# Altium schematic symbol library SCHLIB.SchLib: 2608 symbols (part 18 of 20) (continued)
## R-350mR-2512 (continued)
RES 0.35 OHM 1% 1W 2512; Manufacturer Part Number: WSL2512R3500FEA; Manufacturer: Vishay Dale; Tolerance: 0.01; Temperature Coefficient: ±75ppm/°C; Object  Type: Part; Design Item ID: R-350mR-2512; Power: 1W; Composition: Metal Element; Features: Anti-Sulfur, Automotive AEC-Q200, Current Sense, Moisture Resistant, Pulse Withstanding; Operating Temperature: -65°C ~ 170°C; Height - Seated (Max): 0.89mm; Category: Resistor; Value: 350mR
footprint R2512
pins: 1, 2

## R-357K-0402
designator R?, comment Package: 0402  (hidden comment: 357K)
RES 357K OHM 1% 1/16W 0402; Manufacturer Part Number: RC0402FR-07357KL; Manufacturer: YAGEO; Tolerance: 0.01; Power: 0.063W; Temperature Coefficient: ±100ppm/°C; Object  Type: Part; Design Item ID: R-357K-0402; Value: 357K; Composition: Thick Film; Features: Moisture Resistant; Operating Temperature: -55°C ~ 155°C; Height - Seated (Max): 0.40mm; Category: Resistor
footprint R0402
pins: 1, 2

## R-357K-0603
designator R?, comment Package: 0603  (hidden comment: 357K)
RES SMD 357K OHM 1% 1/10W 0603; Manufacturer Part Number: CRCW0603357KFKEA; Manufacturer: Vishay Dale; Tolerance: 0.01; Power: 0.1W; Temperature Coefficient: ±100ppm/°C; Object  Type: Part; Design Item ID: R-357K-0603; Value: 357K; Composition: Thick Film; Features: Automotive AEC-Q200; Operating Temperature: -55°C ~ 155°C; Height - Seated (Max): 0.50mm; Category: Resistor
footprint R0603
pins: 1, 2

## R-357R-0402
designator R?, comment Package: 0402  (hidden comment: 357R)
RES 357 OHM 1% 1/16W 0402; Manufacturer Part Number: RC0402FR-07357RL; Manufacturer: YAGEO; Tolerance: 0.01; Power: 0.063W; Temperature Coefficient: ±100ppm/°C; Object  Type: Part; Design Item ID: R-357R-0402; Value: 357R; Composition: Thick Film; Features: Moisture Resistant; Operating Temperature: -55°C ~ 155°C; Height - Seated (Max): 0.40mm; Category: Resistor
footprint R0402
pins: 1, 2

## R-357R-0603
designator R?, comment Package: 0603  (hidden comment: 357R)
RES SMD 357 OHM 1% 1/10W 0603; Manufacturer Part Number: CRCW0603357RFKEA; Manufacturer: Vishay Dale; Tolerance: 0.01; Power: 0.1W; Temperature Coefficient: ±100ppm/°C; Object  Type: Part; Design Item ID: R-357R-0603; Value: 357R; Composition: Thick Film; Features: Automotive AEC-Q200; Operating Temperature: -55°C ~ 155°C; Height - Seated (Max): 0.50mm; Category: Resistor
footprint R0603
pins: 1, 2

## R-360K-0402
designator R?, comment Package: 0402  (hidden comment: 360K)
RES 360K OHM 1% 1/16W 0402; Manufacturer Part Number: RC0402FR-07360KL; Manufacturer: YAGEO; Tolerance: 0.01; Power: 0.063W; Temperature Coefficient: ±100ppm/°C; Object  Type: Part; Design Item ID: R-360K-0402; Value: 360K; Composition: Thick Film; Features: Moisture Resistant; Operating Temperature: -55°C ~ 155°C; Height - Seated (Max): 0.40mm; Category: Resistor
footprint R0402
pins: 1, 2

## R-360K-0603
designator R?, comment Package: 0603  (hidden comment: 360K)
RES SMD 360K OHM 1% 1/10W 0603; Manufacturer Part Number: CRCW0603360KFKEA; Manufacturer: Vishay Dale; Tolerance: 0.01; Power: 0.1W; Temperature Coefficient: ±100ppm/°C; Object  Type: Part; Design Item ID: R-360K-0603; Value: 360K; Composition: Thick Film; Features: Automotive AEC-Q200; Operating Temperature: -55°C ~ 155°C; Height - Seated (Max): 0.50mm; Category: Resistor
footprint R0603
pins: 1, 2

## R-360R-0402
designator R?, comment Package: 0402  (hidden comment: 360R)
RES 360 OHM 1% 1/16W 0402; Manufacturer Part Number: RC0402FR-07360RL; Manufacturer: YAGEO; Tolerance: 0.01; Power: 0.063W; Temperature Coefficient: ±100ppm/°C; Object  Type: Part; Design Item ID: R-360R-0402; Value: 360R; Composition: Thick Film; Features: Moisture Resistant; Operating Temperature: -55°C ~ 155°C; Height - Seated (Max): 0.40mm; Category: Resistor
footprint R0402
pins: 1, 2

## R-360R-0603
designator R?, comment Package: 0603  (hidden comment: 360R)
RES SMD 360 OHM 1% 1/10W 0603; Manufacturer Part Number: CRCW0603360RFKEA; Manufacturer: Vishay Dale; Tolerance: 0.01; Power: 0.1W; Temperature Coefficient: ±100ppm/°C; Object  Type: Part; Design Item ID: R-360R-0603; Value: 360R; Composition: Thick Film; Features: Automotive AEC-Q200; Operating Temperature: -55°C ~ 155°C; Height - Seated (Max): 0.50mm; Category: Resistor
footprint R0603
pins: 1, 2

## R-365K-0402
designator R?, comment Package: 0402  (hidden comment: 365K)
RES 365K OHM 1% 1/16W 0402; Manufacturer Part Number: RC0402FR-07365KL; Manufacturer: YAGEO; Tolerance: 0.01; Power: 0.063W; Temperature Coefficient: ±100ppm/°C; Object  Type: Part; Design Item ID: R-365K-0402; Value: 365K; Composition: Thick Film; Features: Moisture Resistant; Operating Temperature: -55°C ~ 155°C; Height - Seated (Max): 0.40mm; Category: Resistor
footprint R0402
pins: 1, 2

## R-365K-0603
designator R?, comment Package: 0603  (hidden comment: 365K)
RES SMD 365K OHM 1% 1/10W 0603; Manufacturer Part Number: CRCW0603365KFKEA; Manufacturer: Vishay Dale; Tolerance: 0.01; Power: 0.1W; Temperature Coefficient: ±100ppm/°C; Object  Type: Part; Design Item ID: R-365K-0603; Value: 365K; Composition: Thick Film; Features: Automotive AEC-Q200; Operating Temperature: -55°C ~ 155°C; Height - Seated (Max): 0.50mm; Category: Resistor
footprint R0603
pins: 1, 2

## R-365R-0402
designator R?, comment Package: 0402  (hidden comment: 365R)
RES 365 OHM 1% 1/16W 0402; Manufacturer Part Number: RC0402FR-07365RL; Manufacturer: YAGEO; Tolerance: 0.01; Power: 0.063W; Temperature Coefficient: ±100ppm/°C; Object  Type: Part; Design Item ID: R-365R-0402; Value: 365R; Composition: Thick Film; Features: Moisture Resistant; Operating Temperature: -55°C ~ 155°C; Height - Seated (Max): 0.40mm; Category: Resistor
footprint R0402
pins: 1, 2

## R-365R-0603
designator R?, comment Package: 0603  (hidden comment: 365R)
RES SMD 365 OHM 1% 1/10W 0603; Manufacturer Part Number: CRCW0603365RFKEA; Manufacturer: Vishay Dale; Tolerance: 0.01; Power: 0.1W; Temperature Coefficient: ±100ppm/°C; Object  Type: Part; Design Item ID: R-365R-0603; Value: 365R; Composition: Thick Film; Features: Automotive AEC-Q200; Operating Temperature: -55°C ~ 155°C; Height - Seated (Max): 0.50mm; Category: Resistor
footprint R0603
pins: 1, 2

## R-374K-0402
designator R?, comment Package: 0402  (hidden comment: 374K)
RES 374K OHM 1% 1/16W 0402; Manufacturer Part Number: RC0402FR-07374KL; Manufacturer: YAGEO; Tolerance: 0.01; Power: 0.063W; Temperature Coefficient: ±100ppm/°C; Object  Type: Part; Design Item ID: R-374K-0402; Value: 374K; Composition: Thick Film; Features: Moisture Resistant; Operating Temperature: -55°C ~ 155°C; Height - Seated (Max): 0.40mm; Category: Resistor
footprint R0402
pins: 1, 2

## R-374K-0603
designator R?, comment Package: 0603  (hidden comment: 374K)
RES SMD 374K OHM 1% 1/10W 0603; Manufacturer Part Number: CRCW0603374KFKEA; Manufacturer: Vishay Dale; Tolerance: 0.01; Power: 0.1W; Temperature Coefficient: ±100ppm/°C; Object  Type: Part; Design Item ID: R-374K-0603; Composition: Thick Film; Features: Automotive AEC-Q200; Operating Temperature: -55°C ~ 155°C; Height - Seated (Max): 0.50mm; Category: Resistor; Value: 374K
footprint R0603
pins: 1, 2

## R-374R-0402
designator R?, comment Package: 0402  (hidden comment: 374R)
RES 374 OHM 1% 1/16W 0402; Manufacturer Part Number: RC0402FR-07374RL; Manufacturer: YAGEO; Tolerance: 0.01; Power: 0.063W; Temperature Coefficient: ±100ppm/°C; Object  Type: Part; Design Item ID: R-374R-0402; Value: 374R; Composition: Thick Film; Features: Moisture Resistant; Operating Temperature: -55°C ~ 155°C; Height - Seated (Max): 0.40mm; Category: Resistor
footprint R0402
pins: 1, 2

## R-374R-0603
designator R?, comment Package: 0603  (hidden comment: 374R)
RES SMD 374 OHM 1% 1/10W 0603; Manufacturer Part Number: CRCW0603374RFKEA; Manufacturer: Vishay Dale; Tolerance: 0.01; Power: 0.1W; Temperature Coefficient: ±100ppm/°C; Object  Type: Part; Design Item ID: R-374R-0603; Value: 374R; Composition: Thick Film; Features: Automotive AEC-Q200; Operating Temperature: -55°C ~ 155°C; Height - Seated (Max): 0.50mm; Category: Resistor
footprint R0603
pins: 1, 2

## R-383K-0402
designator R?, comment Package: 0402  (hidden comment: 383K)
RES 383K OHM 1% 1/16W 0402; Manufacturer Part Number: RC0402FR-07383KL; Manufacturer: YAGEO; Tolerance: 0.01; Power: 0.063W; Temperature Coefficient: ±100ppm/°C; Object  Type: Part; Design Item ID: R-383K-0402; Value: 383K; Composition: Thick Film; Features: Moisture Resistant; Operating Temperature: -55°C ~ 155°C; Height - Seated (Max): 0.40mm; Category: Resistor
footprint R0402
pins: 1, 2

## R-383K-0603
designator R?, comment Package: 0603  (hidden comment: 383K)
RES SMD 383K OHM 1% 1/10W 0603; Manufacturer Part Number: CRCW0603383KFKEA; Manufacturer: Vishay Dale; Tolerance: 0.01; Power: 0.1W; Temperature Coefficient: ±100ppm/°C; Object  Type: Part; Design Item ID: R-383K-0603; Value: 383K; Composition: Thick Film; Features: Automotive AEC-Q200; Operating Temperature: -55°C ~ 155°C; Height - Seated (Max): 0.50mm; Category: Resistor
footprint R0603
pins: 1, 2

## R-383R-0402
designator R?, comment Package: 0402  (hidden comment: 383R)
RES 383 OHM 1% 1/16W 0402; Manufacturer Part Number: RC0402FR-07383RL; Manufacturer: YAGEO; Tolerance: 0.01; Power: 0.063W; Temperature Coefficient: ±100ppm/°C; Object  Type: Part; Design Item ID: R-383R-0402; Value: 383R; Composition: Thick Film; Features: Moisture Resistant; Operating Temperature: -55°C ~ 155°C; Height - Seated (Max): 0.40mm; Category: Resistor
footprint R0402
pins: 1, 2

## R-383R-0603
designator R?, comment Package: 0603  (hidden comment: 383R)
RES SMD 383 OHM 1% 1/10W 0603; Manufacturer Part Number: CRCW0603383RFKEA; Manufacturer: Vishay Dale; Tolerance: 0.01; Power: 0.1W; Temperature Coefficient: ±100ppm/°C; Object  Type: Part; Design Item ID: R-383R-0603; Value: 383R; Composition: Thick Film; Features: Automotive AEC-Q200; Operating Temperature: -55°C ~ 155°C; Height - Seated (Max): 0.50mm; Category: Resistor
footprint R0603
pins: 1, 2

## R-390K-0402
designator R?, comment Package: 0402  (hidden comment: 390K)
RES 390K OHM 1% 1/16W 0402; Manufacturer Part Number: RC0402FR-07390KL; Manufacturer: YAGEO; Tolerance: 0.01; Power: 0.063W; Temperature Coefficient: ±100ppm/°C; Object  Type: Part; Design Item ID: R-390K-0402; Value: 390K; Composition: Thick Film; Features: Moisture Resistant; Operating Temperature: -55°C ~ 155°C; Height - Seated (Max): 0.40mm; Category: Resistor
footprint R0402
pins: 1, 2

## R-390K-0603
designator R?, comment Package: 0603  (hidden comment: 390K)
RES SMD 390K OHM 1% 1/10W 0603; Manufacturer Part Number: CRCW0603390KFKEA; Manufacturer: Vishay Dale; Tolerance: 0.01; Power: 0.1W; Temperature Coefficient: ±100ppm/°C; Object  Type: Part; Design Item ID: R-390K-0603; Value: 390K; Composition: Thick Film; Features: Automotive AEC-Q200; Operating Temperature: -55°C ~ 155°C; Height - Seated (Max): 0.50mm; Category: Resistor
footprint R0603
pins: 1, 2

## R-390mR-2512
designator R?, comment Package: 2512  (hidden comment: 390mR)
RES 0.39 OHM 1% 1W 2512; Manufacturer Part Number: WSL2512R3900FEA; Manufacturer: Vishay Dale; Tolerance: 0.01; Temperature Coefficient: ±75ppm/°C; Object  Type: Part; Design Item ID: R-390mR-2512; Value: 390mR; Power: 1W; Composition: Metal Element; Features: Anti-Sulfur, Automotive AEC-Q200, Current Sense, Moisture Resistant, Pulse Withstanding; Operating Temperature: -65°C ~ 170°C; Height - Seated (Max): 0.89mm; Category: Resistor
footprint R2512
pins: 1, 2

## R-390R-0402
designator R?, comment Package: 0402  (hidden comment: 390R)
RES 390 OHM 1% 1/16W 0402; Manufacturer Part Number: RC0402FR-07390RL; Manufacturer: YAGEO; Tolerance: 0.01; Power: 0.063W; Temperature Coefficient: ±100ppm/°C; Object  Type: Part; Design Item ID: R-390R-0402; Value: 390R; Composition: Thick Film; Features: Moisture Resistant; Operating Temperature: -55°C ~ 155°C; Height - Seated (Max): 0.40mm; Category: Resistor
footprint R0402
pins: 1, 2

## R-390R-0603
designator R?, comment Package: 0603  (hidden comment: 390R)
RES SMD 390 OHM 1% 1/10W 0603; Manufacturer Part Number: CRCW0603390RFKEA; Manufacturer: Vishay Dale; Tolerance: 0.01; Power: 0.1W; Temperature Coefficient: ±100ppm/°C; Object  Type: Part; Design Item ID: R-390R-0603; Value: 390R; Composition: Thick Film; Features: Automotive AEC-Q200; Operating Temperature: -55°C ~ 155°C; Height - Seated (Max): 0.50mm; Category: Resistor
footprint R0603
pins: 1, 2

## R-392K-0402
designator R?, comment Package: 0402  (hidden comment: 392K)
RES 392K OHM 1% 1/16W 0402; Manufacturer Part Number: RC0402FR-07392KL; Manufacturer: YAGEO; Tolerance: 0.01; Power: 0.063W; Temperature Coefficient: ±100ppm/°C; Object  Type: Part; Design Item ID: R-392K-0402; Value: 392K; Composition: Thick Film; Features: Moisture Resistant; Operating Temperature: -55°C ~ 155°C; Height - Seated (Max): 0.40mm; Category: Resistor
footprint R0402
pins: 1, 2

## R-392K-0603
designator R?, comment Package: 0603  (hidden comment: 392K)
RES SMD 392K OHM 1% 1/10W 0603; Manufacturer Part Number: CRCW0603392KFKEA; Manufacturer: Vishay Dale; Tolerance: 0.01; Power: 0.1W; Temperature Coefficient: ±100ppm/°C; Object  Type: Part; Design Item ID: R-392K-0603; Value: 392K; Composition: Thick Film; Features: Automotive AEC-Q200; Operating Temperature: -55°C ~ 155°C; Height - Seated (Max): 0.50mm; Category: Resistor
footprint R0603
pins: 1, 2

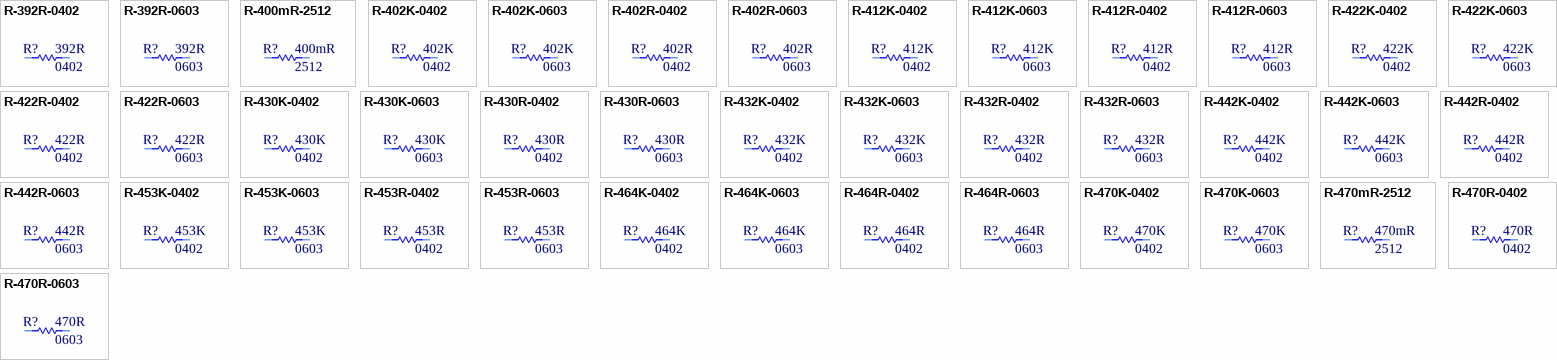
[diagram p77: symbols R-392R-0402 to R-470R-0603]

## R-392R-0402
designator R?, comment Package: 0402  (hidden comment: 392R)
RES 392 OHM 1% 1/16W 0402; Manufacturer Part Number: RC0402FR-07392RL; Manufacturer: YAGEO; Tolerance: 0.01; Power: 0.063W; Temperature Coefficient: ±100ppm/°C; Object  Type: Part; Design Item ID: R-392R-0402; Value: 392R; Composition: Thick Film; Features: Moisture Resistant; Operating Temperature: -55°C ~ 155°C; Height - Seated (Max): 0.40mm; Category: Resistor
footprint R0402
pins: 1, 2

## R-392R-0603
designator R?, comment Package: 0603  (hidden comment: 392R)
RES SMD 392 OHM 1% 1/10W 0603; Manufacturer Part Number: CRCW0603392RFKEA; Manufacturer: Vishay Dale; Tolerance: 0.01; Power: 0.1W; Temperature Coefficient: ±100ppm/°C; Object  Type: Part; Design Item ID: R-392R-0603; Value: 392R; Composition: Thick Film; Features: Automotive AEC-Q200; Operating Temperature: -55°C ~ 155°C; Height - Seated (Max): 0.50mm; Category: Resistor
footprint R0603
pins: 1, 2

## R-400mR-2512
designator R?, comment Package: 2512  (hidden comment: 400mR)
RES 0.4 OHM 1% 1W 2512; Manufacturer Part Number: WSL2512R4000FEA; Manufacturer: Vishay Dale; Tolerance: 0.01; Temperature Coefficient: ±75ppm/°C; Object  Type: Part; Design Item ID: R-400mR-2512; Value: 400mR; Power: 1W; Composition: Metal Element; Features: Anti-Sulfur, Automotive AEC-Q200, Current Sense, Moisture Resistant, Pulse Withstanding; Operating Temperature: -65°C ~ 170°C; Height - Seated (Max): 0.89mm; Category: Resistor
footprint R2512
pins: 1, 2

## R-402K-0402
designator R?, comment Package: 0402  (hidden comment: 402K)
RES 402K OHM 1% 1/16W 0402; Manufacturer Part Number: RC0402FR-07402KL; Manufacturer: YAGEO; Tolerance: 0.01; Power: 0.063W; Temperature Coefficient: ±100ppm/°C; Object  Type: Part; Design Item ID: R-402K-0402; Value: 402K; Composition: Thick Film; Features: Moisture Resistant; Operating Temperature: -55°C ~ 155°C; Height - Seated (Max): 0.40mm; Category: Resistor
footprint R0402
pins: 1, 2

## R-402K-0603
designator R?, comment Package: 0603  (hidden comment: 402K)
RES SMD 402K OHM 1% 1/10W 0603; Manufacturer Part Number: CRCW0603402KFKEA; Manufacturer: Vishay Dale; Tolerance: 0.01; Power: 0.1W; Temperature Coefficient: ±100ppm/°C; Object  Type: Part; Design Item ID: R-402K-0603; Composition: Thick Film; Features: Automotive AEC-Q200; Operating Temperature: -55°C ~ 155°C; Height - Seated (Max): 0.50mm; Category: Resistor; Value: 402K
footprint R0603
pins: 1, 2

## R-402R-0402
designator R?, comment Package: 0402  (hidden comment: 402R)
RES 402 OHM 1% 1/16W 0402; Manufacturer Part Number: RC0402FR-07402RL; Manufacturer: YAGEO; Tolerance: 0.01; Power: 0.063W; Temperature Coefficient: ±100ppm/°C; Object  Type: Part; Design Item ID: R-402R-0402; Value: 402R; Composition: Thick Film; Features: Moisture Resistant; Operating Temperature: -55°C ~ 155°C; Height - Seated (Max): 0.40mm; Category: Resistor
footprint R0402
pins: 1, 2

## R-402R-0603
designator R?, comment Package: 0603  (hidden comment: 402R)
RES SMD 402 OHM 1% 1/10W 0603; Manufacturer Part Number: CRCW0603402RFKEA; Manufacturer: Vishay Dale; Tolerance: 0.01; Power: 0.1W; Temperature Coefficient: ±100ppm/°C; Object  Type: Part; Design Item ID: R-402R-0603; Value: 402R; Composition: Thick Film; Features: Automotive AEC-Q200; Operating Temperature: -55°C ~ 155°C; Height - Seated (Max): 0.50mm; Category: Resistor
footprint R0603
pins: 1, 2

## R-412K-0402
designator R?, comment Package: 0402  (hidden comment: 412K)
RES 412K OHM 1% 1/16W 0402; Manufacturer Part Number: RC0402FR-07412KL; Manufacturer: YAGEO; Tolerance: 0.01; Power: 0.063W; Temperature Coefficient: ±100ppm/°C; Object  Type: Part; Design Item ID: R-412K-0402; Value: 412K; Composition: Thick Film; Features: Moisture Resistant; Operating Temperature: -55°C ~ 155°C; Height - Seated (Max): 0.40mm; Category: Resistor
footprint R0402
pins: 1, 2

## R-412K-0603
designator R?, comment Package: 0603  (hidden comment: 412K)
RES SMD 412K OHM 1% 1/10W 0603; Manufacturer Part Number: CRCW0603412KFKEA; Manufacturer: Vishay Dale; Tolerance: 0.01; Power: 0.1W; Temperature Coefficient: ±100ppm/°C; Object  Type: Part; Design Item ID: R-412K-0603; Value: 412K; Composition: Thick Film; Features: Automotive AEC-Q200; Operating Temperature: -55°C ~ 155°C; Height - Seated (Max): 0.50mm; Category: Resistor
footprint R0603
pins: 1, 2

## R-412R-0402
designator R?, comment Package: 0402  (hidden comment: 412R)
RES 412 OHM 1% 1/16W 0402; Manufacturer Part Number: RC0402FR-07412RL; Manufacturer: YAGEO; Tolerance: 0.01; Power: 0.063W; Temperature Coefficient: ±100ppm/°C; Object  Type: Part; Design Item ID: R-412R-0402; Value: 412R; Composition: Thick Film; Features: Moisture Resistant; Operating Temperature: -55°C ~ 155°C; Height - Seated (Max): 0.40mm; Category: Resistor
footprint R0402
pins: 1, 2

## R-412R-0603
designator R?, comment Package: 0603  (hidden comment: 412R)
RES SMD 412 OHM 1% 1/10W 0603; Manufacturer Part Number: CRCW0603412RFKEA; Manufacturer: Vishay Dale; Tolerance: 0.01; Power: 0.1W; Temperature Coefficient: ±100ppm/°C; Object  Type: Part; Design Item ID: R-412R-0603; Value: 412R; Composition: Thick Film; Features: Automotive AEC-Q200; Operating Temperature: -55°C ~ 155°C; Height - Seated (Max): 0.50mm; Category: Resistor
footprint R0603
pins: 1, 2

## R-422K-0402
designator R?, comment Package: 0402  (hidden comment: 422K)
RES 422K OHM 1% 1/16W 0402; Manufacturer Part Number: RC0402FR-07422KL; Manufacturer: YAGEO; Tolerance: 0.01; Power: 0.063W; Temperature Coefficient: ±100ppm/°C; Object  Type: Part; Design Item ID: R-422K-0402; Value: 422K; Composition: Thick Film; Features: Moisture Resistant; Operating Temperature: -55°C ~ 155°C; Height - Seated (Max): 0.40mm; Category: Resistor
footprint R0402
pins: 1, 2

## R-422K-0603
designator R?, comment Package: 0603  (hidden comment: 422K)
RES SMD 422K OHM 1% 1/10W 0603; Manufacturer Part Number: CRCW0603422KFKEA; Manufacturer: Vishay Dale; Tolerance: 0.01; Power: 0.1W; Temperature Coefficient: ±100ppm/°C; Object  Type: Part; Design Item ID: R-422K-0603; Value: 422K; Composition: Thick Film; Features: Automotive AEC-Q200; Operating Temperature: -55°C ~ 155°C; Height - Seated (Max): 0.50mm; Category: Resistor
footprint R0603
pins: 1, 2

## R-422R-0402
designator R?, comment Package: 0402  (hidden comment: 422R)
RES 422 OHM 1% 1/16W 0402; Manufacturer Part Number: RC0402FR-07422RL; Manufacturer: YAGEO; Tolerance: 0.01; Power: 0.063W; Temperature Coefficient: ±100ppm/°C; Object  Type: Part; Design Item ID: R-422R-0402; Value: 422R; Composition: Thick Film; Features: Moisture Resistant; Operating Temperature: -55°C ~ 155°C; Height - Seated (Max): 0.40mm; Category: Resistor
footprint R0402
pins: 1, 2

## R-422R-0603
designator R?, comment Package: 0603  (hidden comment: 422R)
RES SMD 422 OHM 1% 1/10W 0603; Manufacturer Part Number: CRCW0603422RFKEA; Manufacturer: Vishay Dale; Tolerance: 0.01; Power: 0.1W; Temperature Coefficient: ±100ppm/°C; Object  Type: Part; Design Item ID: R-422R-0603; Value: 422R; Composition: Thick Film; Features: Automotive AEC-Q200; Operating Temperature: -55°C ~ 155°C; Height - Seated (Max): 0.50mm; Category: Resistor
footprint R0603
pins: 1, 2

## R-430K-0402
designator R?, comment Package: 0402  (hidden comment: 430K)
RES 430K OHM 1% 1/16W 0402; Manufacturer Part Number: RC0402FR-07430KL; Manufacturer: YAGEO; Tolerance: 0.01; Power: 0.063W; Temperature Coefficient: ±100ppm/°C; Object  Type: Part; Design Item ID: R-430K-0402; Value: 430K; Composition: Thick Film; Features: Moisture Resistant; Operating Temperature: -55°C ~ 155°C; Height - Seated (Max): 0.40mm; Category: Resistor
footprint R0402
pins: 1, 2

## R-430K-0603
designator R?, comment Package: 0603  (hidden comment: 430K)
RES SMD 430K OHM 1% 1/10W 0603; Manufacturer Part Number: CRCW0603430KFKEA; Manufacturer: Vishay Dale; Tolerance: 0.01; Power: 0.1W; Temperature Coefficient: ±100ppm/°C; Object  Type: Part; Design Item ID: R-430K-0603; Value: 430K; Composition: Thick Film; Features: Automotive AEC-Q200; Operating Temperature: -55°C ~ 155°C; Height - Seated (Max): 0.50mm; Category: Resistor
footprint R0603
pins: 1, 2

## R-430R-0402
designator R?, comment Package: 0402  (hidden comment: 430R)
RES 430 OHM 1% 1/16W 0402; Manufacturer Part Number: RC0402FR-07430RL; Manufacturer: YAGEO; Tolerance: 0.01; Power: 0.063W; Temperature Coefficient: ±100ppm/°C; Object  Type: Part; Design Item ID: R-430R-0402; Value: 430R; Composition: Thick Film; Features: Moisture Resistant; Operating Temperature: -55°C ~ 155°C; Height - Seated (Max): 0.40mm; Category: Resistor
footprint R0402
pins: 1, 2

## R-430R-0603
designator R?, comment Package: 0603  (hidden comment: 430R)
RES SMD 430 OHM 1% 1/10W 0603; Manufacturer Part Number: CRCW0603430RFKEA; Manufacturer: Vishay Dale; Tolerance: 0.01; Power: 0.1W; Temperature Coefficient: ±100ppm/°C; Object  Type: Part; Design Item ID: R-430R-0603; Value: 430R; Composition: Thick Film; Features: Automotive AEC-Q200; Operating Temperature: -55°C ~ 155°C; Height - Seated (Max): 0.50mm; Category: Resistor
footprint R0603
pins: 1, 2

## R-432K-0402
designator R?, comment Package: 0402  (hidden comment: 432K)
RES 432K OHM 1% 1/16W 0402; Manufacturer Part Number: RC0402FR-07432KL; Manufacturer: YAGEO; Tolerance: 0.01; Power: 0.063W; Temperature Coefficient: ±100ppm/°C; Object  Type: Part; Design Item ID: R-432K-0402; Value: 432K; Composition: Thick Film; Features: Moisture Resistant; Operating Temperature: -55°C ~ 155°C; Height - Seated (Max): 0.40mm; Category: Resistor
footprint R0402
pins: 1, 2

## R-432K-0603
designator R?, comment Package: 0603  (hidden comment: 432K)
RES SMD 432K OHM 1% 1/10W 0603; Manufacturer Part Number: CRCW0603432KFKEA; Manufacturer: Vishay Dale; Tolerance: 0.01; Power: 0.1W; Temperature Coefficient: ±100ppm/°C; Object  Type: Part; Design Item ID: R-432K-0603; Value: 432K; Composition: Thick Film; Features: Automotive AEC-Q200; Operating Temperature: -55°C ~ 155°C; Height - Seated (Max): 0.50mm; Category: Resistor
footprint R0603
pins: 1, 2

## R-432R-0402
designator R?, comment Package: 0402  (hidden comment: 432R)
RES 432 OHM 1% 1/16W 0402; Manufacturer Part Number: RC0402FR-07432RL; Manufacturer: YAGEO; Tolerance: 0.01; Power: 0.063W; Temperature Coefficient: ±100ppm/°C; Object  Type: Part; Design Item ID: R-432R-0402; Value: 432R; Composition: Thick Film; Features: Moisture Resistant; Operating Temperature: -55°C ~ 155°C; Height - Seated (Max): 0.40mm; Category: Resistor
footprint R0402
pins: 1, 2

## R-432R-0603
designator R?, comment Package: 0603  (hidden comment: 432R)
RES SMD 432 OHM 1% 1/10W 0603; Manufacturer Part Number: CRCW0603432RFKEA; Manufacturer: Vishay Dale; Tolerance: 0.01; Power: 0.1W; Temperature Coefficient: ±100ppm/°C; Object  Type: Part; Design Item ID: R-432R-0603; Value: 432R; Composition: Thick Film; Features: Automotive AEC-Q200; Operating Temperature: -55°C ~ 155°C; Height - Seated (Max): 0.50mm; Category: Resistor
footprint R0603
pins: 1, 2

## R-442K-0402
designator R?, comment Package: 0402  (hidden comment: 442K)
RES 442K OHM 1% 1/16W 0402; Manufacturer Part Number: RC0402FR-07442KL; Manufacturer: YAGEO; Tolerance: 0.01; Power: 0.063W; Temperature Coefficient: ±100ppm/°C; Object  Type: Part; Design Item ID: R-442K-0402; Value: 442K; Composition: Thick Film; Features: Moisture Resistant; Operating Temperature: -55°C ~ 155°C; Height - Seated (Max): 0.40mm; Category: Resistor
footprint R0402
pins: 1, 2

## R-442K-0603
designator R?, comment Package: 0603  (hidden comment: 442K)
RES SMD 442K OHM 1% 1/10W 0603; Manufacturer Part Number: CRCW0603442KFKEA; Manufacturer: Vishay Dale; Tolerance: 0.01; Power: 0.1W; Temperature Coefficient: ±100ppm/°C; Object  Type: Part; Design Item ID: R-442K-0603; Value: 442K; Composition: Thick Film; Features: Automotive AEC-Q200; Operating Temperature: -55°C ~ 155°C; Height - Seated (Max): 0.50mm; Category: Resistor
footprint R0603
pins: 1, 2

## R-442R-0402
designator R?, comment Package: 0402  (hidden comment: 442R)
RES 442 OHM 1% 1/16W 0402; Manufacturer Part Number: RC0402FR-07442RL; Manufacturer: YAGEO; Tolerance: 0.01; Power: 0.063W; Temperature Coefficient: ±100ppm/°C; Object  Type: Part; Design Item ID: R-442R-0402; Value: 442R; Composition: Thick Film; Features: Moisture Resistant; Operating Temperature: -55°C ~ 155°C; Height - Seated (Max): 0.40mm; Category: Resistor
footprint R0402
pins: 1, 2

## R-442R-0603
designator R?, comment Package: 0603  (hidden comment: 442R)
RES SMD 442 OHM 1% 1/10W 0603; Manufacturer Part Number: CRCW0603442RFKEA; Manufacturer: Vishay Dale; Tolerance: 0.01; Power: 0.1W; Temperature Coefficient: ±100ppm/°C; Object  Type: Part; Design Item ID: R-442R-0603; Value: 442R; Composition: Thick Film; Features: Automotive AEC-Q200; Operating Temperature: -55°C ~ 155°C; Height - Seated (Max): 0.50mm; Category: Resistor
footprint R0603
pins: 1, 2

## R-453K-0402
designator R?, comment Package: 0402  (hidden comment: 453K)
RES 453K OHM 1% 1/16W 0402; Manufacturer Part Number: RC0402FR-07453KL; Manufacturer: YAGEO; Tolerance: 0.01; Power: 0.063W; Temperature Coefficient: ±100ppm/°C; Object  Type: Part; Design Item ID: R-453K-0402; Value: 453K; Composition: Thick Film; Features: Moisture Resistant; Operating Temperature: -55°C ~ 155°C; Height - Seated (Max): 0.40mm; Category: Resistor
footprint R0402
pins: 1, 2

## R-453K-0603
designator R?, comment Package: 0603  (hidden comment: 453K)
RES SMD 453K OHM 1% 1/10W 0603; Manufacturer Part Number: CRCW0603453KFKEA; Manufacturer: Vishay Dale; Tolerance: 0.01; Power: 0.1W; Temperature Coefficient: ±100ppm/°C; Object  Type: Part; Design Item ID: R-453K-0603; Value: 453K; Composition: Thick Film; Features: Automotive AEC-Q200; Operating Temperature: -55°C ~ 155°C; Height - Seated (Max): 0.50mm; Category: Resistor
footprint R0603
pins: 1, 2

## R-453R-0402
designator R?, comment Package: 0402  (hidden comment: 453R)
RES 453 OHM 1% 1/16W 0402; Manufacturer Part Number: RC0402FR-07453RL; Manufacturer: YAGEO; Tolerance: 0.01; Power: 0.063W; Temperature Coefficient: ±100ppm/°C; Object  Type: Part; Design Item ID: R-453R-0402; Value: 453R; Composition: Thick Film; Features: Moisture Resistant; Operating Temperature: -55°C ~ 155°C; Height - Seated (Max): 0.40mm; Category: Resistor
footprint R0402
pins: 1, 2

## R-453R-0603
designator R?, comment Package: 0603  (hidden comment: 453R)
RES SMD 453 OHM 1% 1/10W 0603; Manufacturer Part Number: CRCW0603453RFKEA; Manufacturer: Vishay Dale; Tolerance: 0.01; Power: 0.1W; Temperature Coefficient: ±100ppm/°C; Object  Type: Part; Design Item ID: R-453R-0603; Value: 453R; Composition: Thick Film; Features: Automotive AEC-Q200; Operating Temperature: -55°C ~ 155°C; Height - Seated (Max): 0.50mm; Category: Resistor
footprint R0603
pins: 1, 2

## R-464K-0402
designator R?, comment Package: 0402  (hidden comment: 464K)
RES 464K OHM 1% 1/16W 0402; Manufacturer Part Number: RC0402FR-07464KL; Manufacturer: YAGEO; Tolerance: 0.01; Power: 0.063W; Temperature Coefficient: ±100ppm/°C; Object  Type: Part; Design Item ID: R-464K-0402; Value: 464K; Composition: Thick Film; Features: Moisture Resistant; Operating Temperature: -55°C ~ 155°C; Height - Seated (Max): 0.40mm; Category: Resistor
footprint R0402
pins: 1, 2

## R-464K-0603
designator R?, comment Package: 0603  (hidden comment: 464K)
RES SMD 464K OHM 1% 1/10W 0603; Manufacturer Part Number: CRCW0603464KFKEA; Manufacturer: Vishay Dale; Tolerance: 0.01; Power: 0.1W; Temperature Coefficient: ±100ppm/°C; Object  Type: Part; Design Item ID: R-464K-0603; Value: 464K; Composition: Thick Film; Features: Automotive AEC-Q200; Operating Temperature: -55°C ~ 155°C; Height - Seated (Max): 0.50mm; Category: Resistor
footprint R0603
pins: 1, 2

## R-464R-0402
designator R?, comment Package: 0402  (hidden comment: 464R)
RES 464 OHM 1% 1/16W 0402; Manufacturer Part Number: RC0402FR-07464RL; Manufacturer: YAGEO; Tolerance: 0.01; Power: 0.063W; Temperature Coefficient: ±100ppm/°C; Object  Type: Part; Design Item ID: R-464R-0402; Value: 464R; Composition: Thick Film; Features: Moisture Resistant; Operating Temperature: -55°C ~ 155°C; Height - Seated (Max): 0.40mm; Category: Resistor
footprint R0402
pins: 1, 2

## R-464R-0603
designator R?, comment Package: 0603  (hidden comment: 464R)
RES SMD 464 OHM 1% 1/10W 0603; Manufacturer Part Number: CRCW0603464RFKEA; Manufacturer: Vishay Dale; Tolerance: 0.01; Power: 0.1W; Temperature Coefficient: ±100ppm/°C; Object  Type: Part; Design Item ID: R-464R-0603; Value: 464R; Composition: Thick Film; Features: Automotive AEC-Q200; Operating Temperature: -55°C ~ 155°C; Height - Seated (Max): 0.50mm; Category: Resistor
footprint R0603
pins: 1, 2

## R-470K-0402
designator R?, comment Package: 0402  (hidden comment: 470K)
RES 470K OHM 1% 1/16W 0402; Manufacturer Part Number: RC0402FR-07470KL; Manufacturer: YAGEO; Tolerance: 0.01; Power: 0.063W; Temperature Coefficient: ±100ppm/°C; Object  Type: Part; Design Item ID: R-470K-0402; Value: 470K; Composition: Thick Film; Features: Moisture Resistant; Operating Temperature: -55°C ~ 155°C; Height - Seated (Max): 0.40mm; Category: Resistor
footprint R0402
pins: 1, 2

## R-470K-0603
designator R?, comment Package: 0603  (hidden comment: 470K)
RES SMD 470K OHM 1% 1/10W 0603; Manufacturer Part Number: CRCW0603470KFKEA; Manufacturer: Vishay Dale; Tolerance: 0.01; Power: 0.1W; Temperature Coefficient: ±100ppm/°C; Object  Type: Part; Design Item ID: R-470K-0603; Value: 470K; Composition: Thick Film; Features: Automotive AEC-Q200; Operating Temperature: -55°C ~ 155°C; Height - Seated (Max): 0.50mm; Category: Resistor
footprint R0603
pins: 1, 2

## R-470mR-2512
designator R?, comment Package: 2512  (hidden comment: 470mR)
RES 0.47 OHM 1% 1W 2512; Manufacturer Part Number: WSL2512R4700FEA; Manufacturer: Vishay Dale; Tolerance: 0.01; Temperature Coefficient: ±75ppm/°C; Object  Type: Part; Design Item ID: R-470mR-2512; Value: 470mR; Power: 1W; Composition: Metal Element; Features: Anti-Sulfur, Automotive AEC-Q200, Current Sense, Moisture Resistant, Pulse Withstanding; Operating Temperature: -65°C ~ 170°C; Height - Seated (Max): 0.89mm; Category: Resistor
footprint R2512
pins: 1, 2

## R-470R-0402
designator R?, comment Package: 0402  (hidden comment: 470R)
RES 470 OHM 1% 1/16W 0402; Manufacturer Part Number: RC0402FR-07470RL; Manufacturer: YAGEO; Tolerance: 0.01; Power: 0.063W; Temperature Coefficient: ±100ppm/°C; Object  Type: Part; Design Item ID: R-470R-0402; Composition: Thick Film; Features: Moisture Resistant; Operating Temperature: -55°C ~ 155°C; Height - Seated (Max): 0.40mm; Category: Resistor; Value: 470R
footprint R0402
pins: 1, 2

## R-470R-0603
designator R?, comment Package: 0603  (hidden comment: 470R)
RES SMD 470 OHM 1% 1/10W 0603; Manufacturer Part Number: CRCW0603470RFKEA; Manufacturer: Vishay Dale; Tolerance: 0.01; Power: 0.1W; Temperature Coefficient: ±100ppm/°C; Object  Type: Part; Design Item ID: R-470R-0603; Value: 470R; Composition: Thick Film; Features: Automotive AEC-Q200; Operating Temperature: -55°C ~ 155°C; Height - Seated (Max): 0.50mm; Category: Resistor
footprint R0603
pins: 1, 2

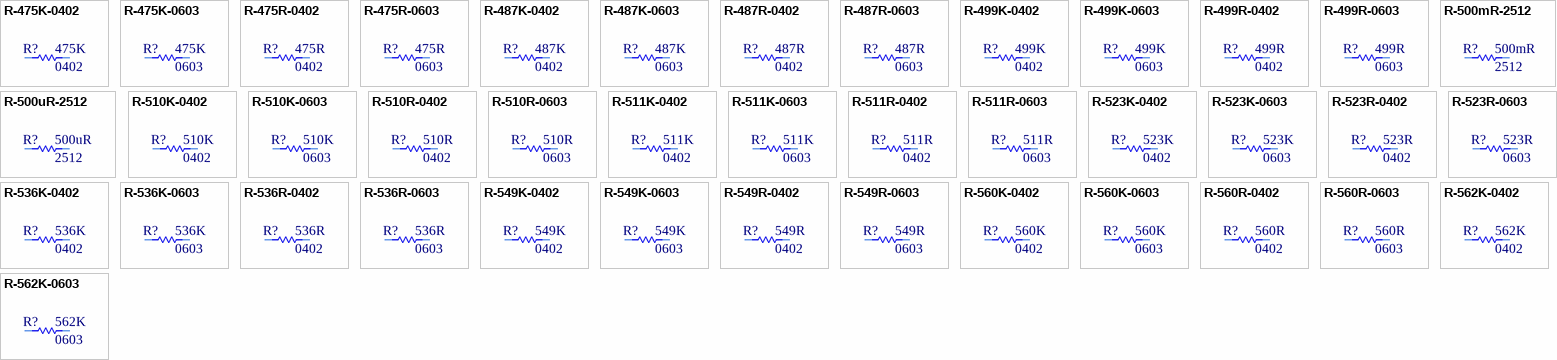
[diagram p78: symbols R-475K-0402 to R-562K-0603]

## R-475K-0402
designator R?, comment Package: 0402  (hidden comment: 475K)
RES 475K OHM 1% 1/16W 0402; Manufacturer Part Number: RC0402FR-07475KL; Manufacturer: YAGEO; Tolerance: 0.01; Power: 0.063W; Temperature Coefficient: ±100ppm/°C; Object  Type: Part; Design Item ID: R-475K-0402; Value: 475K; Composition: Thick Film; Features: Moisture Resistant; Operating Temperature: -55°C ~ 155°C; Height - Seated (Max): 0.40mm; Category: Resistor
footprint R0402
pins: 1, 2

## R-475K-0603
designator R?, comment Package: 0603  (hidden comment: 475K)
RES SMD 475K OHM 1% 1/10W 0603; Manufacturer Part Number: CRCW0603475KFKEA; Manufacturer: Vishay Dale; Tolerance: 0.01; Power: 0.1W; Temperature Coefficient: ±100ppm/°C; Object  Type: Part; Design Item ID: R-475K-0603; Composition: Thick Film; Features: Automotive AEC-Q200; Operating Temperature: -55°C ~ 155°C; Height - Seated (Max): 0.50mm; Category: Resistor; Value: 475K
footprint R0603
pins: 1, 2

## R-475R-0402
designator R?, comment Package: 0402  (hidden comment: 475R)
RES 475 OHM 1% 1/16W 0402; Manufacturer Part Number: RC0402FR-07475RL; Manufacturer: YAGEO; Tolerance: 0.01; Power: 0.063W; Temperature Coefficient: ±100ppm/°C; Object  Type: Part; Design Item ID: R-475R-0402; Value: 475R; Composition: Thick Film; Features: Moisture Resistant; Operating Temperature: -55°C ~ 155°C; Height - Seated (Max): 0.40mm; Category: Resistor
footprint R0402
pins: 1, 2

## R-475R-0603
designator R?, comment Package: 0603  (hidden comment: 475R)
RES SMD 475 OHM 1% 1/10W 0603; Manufacturer Part Number: CRCW0603475RFKEA; Manufacturer: Vishay Dale; Tolerance: 0.01; Power: 0.1W; Temperature Coefficient: ±100ppm/°C; Object  Type: Part; Design Item ID: R-475R-0603; Value: 475R; Composition: Thick Film; Features: Automotive AEC-Q200; Operating Temperature: -55°C ~ 155°C; Height - Seated (Max): 0.50mm; Category: Resistor
footprint R0603
pins: 1, 2

## R-487K-0402
designator R?, comment Package: 0402  (hidden comment: 487K)
RES 487K OHM 1% 1/16W 0402; Manufacturer Part Number: RC0402FR-07487KL; Manufacturer: YAGEO; Tolerance: 0.01; Power: 0.063W; Temperature Coefficient: ±100ppm/°C; Object  Type: Part; Design Item ID: R-487K-0402; Value: 487K; Composition: Thick Film; Features: Moisture Resistant; Operating Temperature: -55°C ~ 155°C; Height - Seated (Max): 0.40mm; Category: Resistor
footprint R0402
pins: 1, 2

## R-487K-0603
designator R?, comment Package: 0603  (hidden comment: 487K)
RES SMD 487K OHM 1% 1/10W 0603; Manufacturer Part Number: CRCW0603487KFKEA; Manufacturer: Vishay Dale; Tolerance: 0.01; Power: 0.1W; Temperature Coefficient: ±100ppm/°C; Object  Type: Part; Design Item ID: R-487K-0603; Value: 487K; Composition: Thick Film; Features: Automotive AEC-Q200; Operating Temperature: -55°C ~ 155°C; Height - Seated (Max): 0.50mm; Category: Resistor
footprint R0603
pins: 1, 2

## R-487R-0402
designator R?, comment Package: 0402  (hidden comment: 487R)
RES 487 OHM 1% 1/16W 0402; Manufacturer Part Number: RC0402FR-07487RL; Manufacturer: YAGEO; Tolerance: 0.01; Power: 0.063W; Temperature Coefficient: ±100ppm/°C; Object  Type: Part; Design Item ID: R-487R-0402; Value: 487R; Composition: Thick Film; Features: Moisture Resistant; Operating Temperature: -55°C ~ 155°C; Height - Seated (Max): 0.40mm; Category: Resistor
footprint R0402
pins: 1, 2

## R-487R-0603
designator R?, comment Package: 0603  (hidden comment: 487R)
RES SMD 487 OHM 1% 1/10W 0603; Manufacturer Part Number: CRCW0603487RFKEA; Manufacturer: Vishay Dale; Tolerance: 0.01; Power: 0.1W; Temperature Coefficient: ±100ppm/°C; Object  Type: Part; Design Item ID: R-487R-0603; Value: 487R; Composition: Thick Film; Features: Automotive AEC-Q200; Operating Temperature: -55°C ~ 155°C; Height - Seated (Max): 0.50mm; Category: Resistor
footprint R0603
pins: 1, 2

## R-499K-0402
designator R?, comment Package: 0402  (hidden comment: 499K)
RES 499K OHM 1% 1/16W 0402; Manufacturer Part Number: RC0402FR-07499KL; Manufacturer: YAGEO; Tolerance: 0.01; Power: 0.063W; Temperature Coefficient: ±100ppm/°C; Object  Type: Part; Design Item ID: R-499K-0402; Value: 499K; Composition: Thick Film; Features: Moisture Resistant; Operating Temperature: -55°C ~ 155°C; Height - Seated (Max): 0.40mm; Category: Resistor
footprint R0402
pins: 1, 2

## R-499K-0603
designator R?, comment Package: 0603  (hidden comment: 499K)
RES SMD 499K OHM 1% 1/10W 0603; Manufacturer Part Number: CRCW0603499KFKEA; Manufacturer: Vishay Dale; Tolerance: 0.01; Power: 0.1W; Temperature Coefficient: ±100ppm/°C; Object  Type: Part; Design Item ID: R-499K-0603; Value: 499K; Composition: Thick Film; Features: Automotive AEC-Q200; Operating Temperature: -55°C ~ 155°C; Height - Seated (Max): 0.50mm; Category: Resistor
footprint R0603
pins: 1, 2

## R-499R-0402
designator R?, comment Package: 0402  (hidden comment: 499R)
RES 499 OHM 1% 1/16W 0402; Manufacturer Part Number: RC0402FR-07499RL; Manufacturer: YAGEO; Tolerance: 0.01; Power: 0.063W; Temperature Coefficient: ±100ppm/°C; Object  Type: Part; Design Item ID: R-499R-0402; Value: 499R; Composition: Thick Film; Features: Moisture Resistant; Operating Temperature: -55°C ~ 155°C; Height - Seated (Max): 0.40mm; Category: Resistor
footprint R0402
pins: 1, 2

## R-499R-0603
designator R?, comment Package: 0603  (hidden comment: 499R)
RES SMD 499 OHM 1% 1/10W 0603; Manufacturer Part Number: CRCW0603499RFKEA; Manufacturer: Vishay Dale; Tolerance: 0.01; Power: 0.1W; Temperature Coefficient: ±100ppm/°C; Object  Type: Part; Design Item ID: R-499R-0603; Value: 499R; Composition: Thick Film; Features: Automotive AEC-Q200; Operating Temperature: -55°C ~ 155°C; Height - Seated (Max): 0.50mm; Category: Resistor
footprint R0603
pins: 1, 2

## R-500mR-2512
designator R?, comment Package: 2512  (hidden comment: 500mR)
RES 0.5 OHM 1% 1W 2512; Manufacturer Part Number: WSL2512R5000FEA; Manufacturer: Vishay Dale; Tolerance: 0.01; Temperature Coefficient: ±75ppm/°C; Object  Type: Part; Design Item ID: R-500mR-2512; Value: 500mR; Power: 1W; Composition: Metal Element; Features: Anti-Sulfur, Automotive AEC-Q200, Current Sense, Moisture Resistant, Pulse Withstanding; Operating Temperature: -65°C ~ 170°C; Height - Seated (Max): 0.89mm; Category: Resistor
footprint R2512
pins: 1, 2

## R-500uR-2512
designator R?, comment Package: 2512  (hidden comment: 500uR)
RES 500 UOHM 1% 1W 2512; Manufacturer Part Number: WSL2512L5000FEA; Manufacturer: Vishay Dale; Tolerance: 0.01; Temperature Coefficient: ±400ppm/°C; Object  Type: Part; Design Item ID: R-500uR-2512; Value: 500uR; Power: 1W; Composition: Metal Element; Features: Automotive AEC-Q200, Current Sense, Moisture Resistant, Pulse Withstanding; Operating Temperature: -65°C ~ 170°C; Height - Seated (Max): 0.89mm; Category: Resistor
footprint R2512
pins: 1, 2

## R-510K-0402
designator R?, comment Package: 0402  (hidden comment: 510K)
RES 510K OHM 1% 1/16W 0402; Manufacturer Part Number: RC0402FR-07510KL; Manufacturer: YAGEO; Tolerance: 0.01; Power: 0.063W; Temperature Coefficient: ±100ppm/°C; Object  Type: Part; Design Item ID: R-510K-0402; Composition: Thick Film; Features: Moisture Resistant; Operating Temperature: -55°C ~ 155°C; Height - Seated (Max): 0.40mm; Category: Resistor; Value: 510K
footprint R0402
pins: 1, 2

## R-510K-0603
designator R?, comment Package: 0603  (hidden comment: 510K)
RES SMD 510K OHM 1% 1/10W 0603; Manufacturer Part Number: CRCW0603510KFKEA; Manufacturer: Vishay Dale; Tolerance: 0.01; Power: 0.1W; Temperature Coefficient: ±100ppm/°C; Object  Type: Part; Design Item ID: R-510K-0603; Value: 510K; Composition: Thick Film; Features: Automotive AEC-Q200; Operating Temperature: -55°C ~ 155°C; Height - Seated (Max): 0.50mm; Category: Resistor
footprint R0603
pins: 1, 2

## R-510R-0402
designator R?, comment Package: 0402  (hidden comment: 510R)
RES 510 OHM 1% 1/16W 0402; Manufacturer Part Number: RC0402FR-07510RL; Manufacturer: YAGEO; Tolerance: 0.01; Power: 0.063W; Temperature Coefficient: ±100ppm/°C; Object  Type: Part; Design Item ID: R-510R-0402; Value: 510R; Composition: Thick Film; Features: Moisture Resistant; Operating Temperature: -55°C ~ 155°C; Height - Seated (Max): 0.40mm; Category: Resistor
footprint R0402
pins: 1, 2

## R-510R-0603
designator R?, comment Package: 0603  (hidden comment: 510R)
RES SMD 510 OHM 1% 1/10W 0603; Manufacturer Part Number: CRCW0603510RFKEA; Manufacturer: Vishay Dale; Tolerance: 0.01; Power: 0.1W; Temperature Coefficient: ±100ppm/°C; Object  Type: Part; Design Item ID: R-510R-0603; Value: 510R; Composition: Thick Film; Features: Automotive AEC-Q200; Operating Temperature: -55°C ~ 155°C; Height - Seated (Max): 0.50mm; Category: Resistor
footprint R0603
pins: 1, 2

## R-511K-0402
designator R?, comment Package: 0402  (hidden comment: 511K)
RES 511K OHM 1% 1/16W 0402; Manufacturer Part Number: RC0402FR-07511KL; Manufacturer: YAGEO; Tolerance: 0.01; Power: 0.063W; Temperature Coefficient: ±100ppm/°C; Object  Type: Part; Design Item ID: R-511K-0402; Value: 511K; Composition: Thick Film; Features: Moisture Resistant; Operating Temperature: -55°C ~ 155°C; Height - Seated (Max): 0.40mm; Category: Resistor
footprint R0402
pins: 1, 2

## R-511K-0603
designator R?, comment Package: 0603  (hidden comment: 511K)
RES SMD 511K OHM 1% 1/10W 0603; Manufacturer Part Number: CRCW0603511KFKEA; Manufacturer: Vishay Dale; Tolerance: 0.01; Power: 0.1W; Temperature Coefficient: ±100ppm/°C; Object  Type: Part; Design Item ID: R-511K-0603; Value: 511K; Composition: Thick Film; Features: Automotive AEC-Q200; Operating Temperature: -55°C ~ 155°C; Height - Seated (Max): 0.50mm; Category: Resistor
footprint R0603
pins: 1, 2

## R-511R-0402
designator R?, comment Package: 0402  (hidden comment: 511R)
RES 511 OHM 1% 1/16W 0402; Manufacturer Part Number: RC0402FR-07511RL; Manufacturer: YAGEO; Tolerance: 0.01; Power: 0.063W; Temperature Coefficient: ±100ppm/°C; Object  Type: Part; Design Item ID: R-511R-0402; Value: 511R; Composition: Thick Film; Features: Moisture Resistant; Operating Temperature: -55°C ~ 155°C; Height - Seated (Max): 0.40mm; Category: Resistor
footprint R0402
pins: 1, 2